# Altium footprint library HW_HOLLAND_NCDM_MONITOR_R1.PcbLib: 472 footprints (part 16 of 30)
Each footprint in its own frame and in the unit in brackets; x right, y up, seen from the top. Pads: shape width x height; smd on the part's side, far side on the other; paste and mask are expansions set on the pad; w line width, h text height; cw(c..) or ccw(c..) is an arc to the next point about the centre after c.
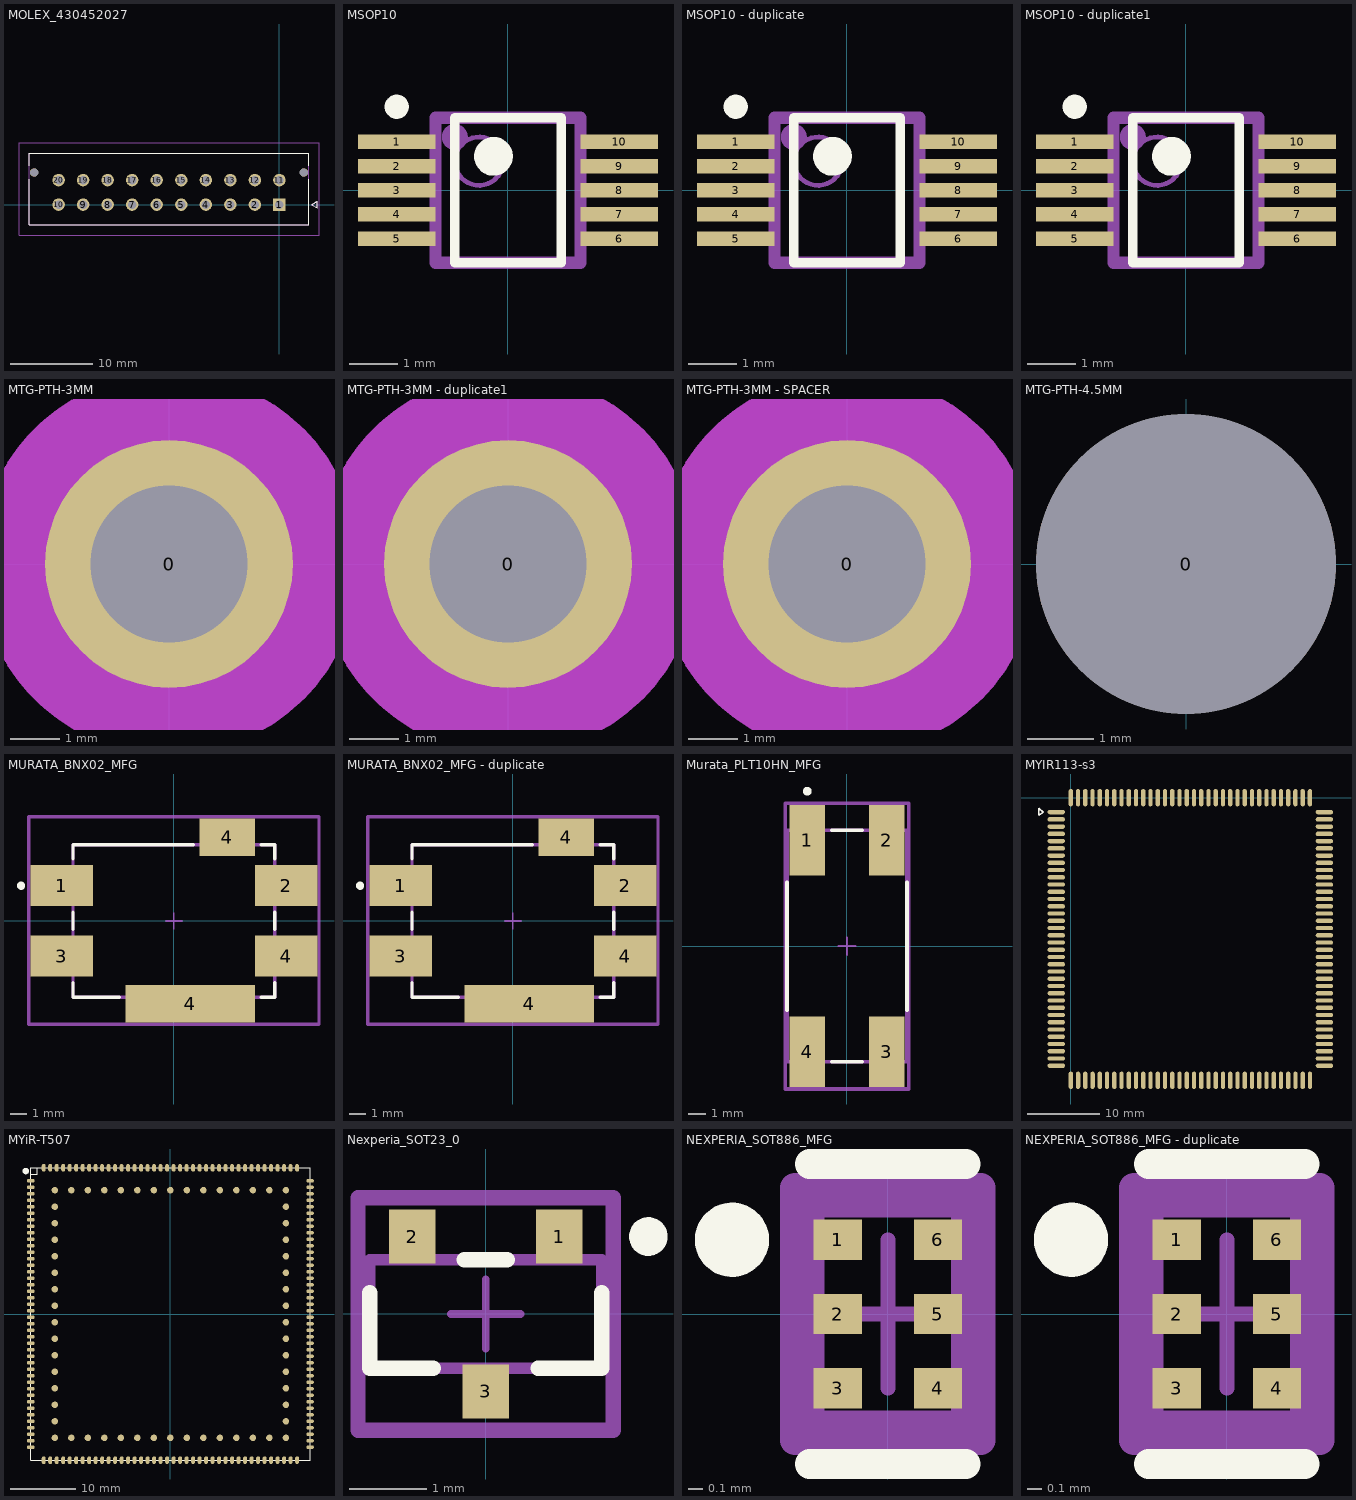
[diagram p15: the footprints below, top view; thin cyan lines are the x and y axes]

## MOLEX_430452027 [mm]
height 9.91
pads (22):
  rect 1.52x1.52 / inner round 1.52 / far side rect 1.52x1.52 hole 1.02 mask+0.076: 1(0,0)
  round 1.52 hole 1.02 mask+0.076: 2(-3,0) 3(-6,0) 4(-9,0) 5(-12,0) 6(-15,0) 7(-18,0) 8(-21,0) 9(-24,0) 10(-27,0) 11(0,3) 12(-3,3) 13(-6,3) 14(-9,3) 15(-12,3) 16(-15,3) 17(-18,3) 18(-21,3) 19(-24,3) 20(-27,3)
  round 1.02 hole 1.02 unplated mask+0.076: ""(-30,3.94) ""(3,3.94)
Top Overlay:
  lines w0.127: -30.575,3.11 -30.575,-2.47 3.575,-2.47 3.575,3.11 ; -30.575,4.77 -30.575,6.3 3.575,6.3 3.575,4.77 ; 3.93,0 4.63,-0.4 4.63,0.4 3.93,0
Mechanical 13:
  lines w0.127: -30.575,-2.47 -30.575,6.3 3.575,6.3 3.575,-2.47 -30.575,-2.47 ; 3.93,0 4.63,-0.4 4.63,0.4 3.93,0
  text "NPTH D1.02 +/- 0.05" at -30.5,-6.24 h0.5
  text "PTH D1.02 +/- 0.05" at -30.5,-5.47 h0.5
Mechanical 15:
  lines w0.05: -31.845,-3.74 -31.845,7.57 4.845,7.57 4.845,-3.74 -31.845,-3.74
3D body "43045-2027.stp": height 9.92, standoff -3.17, extent -30.575,-2.5 3.575,6.27

## MSOP10 [mm]
pads (10):
  rect 1.6x0.3 smd mask+0.05: 1(-2.3,1) 2(-2.3,0.5) 3(-2.3,0) 4(-2.3,-0.5) 5(-2.3,-1) 6(2.3,-1) 7(2.3,-0.5) 8(2.3,0) 9(2.3,0.5) 10(2.3,1)
Top Overlay:
  circle w0.4: c-0.3,0.7 r0.2
  circle w0.25: c-2.3,1.725 r0.125
  lines w0.2: -1.1,-1.5 1.1,-1.5 1.1,1.5 -1.1,1.5 -1.1,-1.5
Top 3D Body:
  circle w0.1: c-0.6,0.6 r0.5
  lines w0.1: -1.5,-1.5 1.5,-1.5 1.5,1.5 -1.5,1.5 -1.5,-1.5
Top Designator:
  circle w0.254: c-1.1,1.1 r0.141
  lines w0.254: -2.3,-1 -1.5,-1 ; -2.3,-0.5 -1.5,-0.5 ; -2.3,0 -1.5,0 ; -2.3,0.5 -1.5,0.5 ; -2.3,1 -1.5,1 ; 1.5,-1 2.3,-1 ; 1.5,-0.5 2.3,-0.5 ; 1.5,0 2.3,0 ; 1.5,0.5 2.3,0.5 ; 1.5,1 2.3,1 ; -1.5,-1.5 -1.5,1.5 1.5,1.5 1.5,-1.5 -1.5,-1.5
  text ".Designator" at -0.339,5.078 h1.02
3D body "MSOP10.step": height 1.1, standoff 0, extent -2.45,-1.5 2.45,1.5

## MSOP10 - duplicate [mm]
pads (10):
  rect 1.6x0.3 smd mask+0.05: 1(-2.3,1) 2(-2.3,0.5) 3(-2.3,0) 4(-2.3,-0.5) 5(-2.3,-1) 6(2.3,-1) 7(2.3,-0.5) 8(2.3,0) 9(2.3,0.5) 10(2.3,1)
Top Overlay:
  circle w0.25: c-2.3,1.725 r0.125
  circle w0.4: c-0.3,0.7 r0.2
  lines w0.2: -1.1,-1.5 -1.1,1.5 1.1,1.5 1.1,-1.5 -1.1,-1.5
Top 3D Body:
  circle w0.1: c-0.6,0.6 r0.5
  lines w0.1: -1.5,-1.5 -1.5,1.5 1.5,1.5 1.5,-1.5 -1.5,-1.5
Top Designator:
  circle w0.254: c-1.1,1.1 r0.141
  lines w0.254: -2.3,-1 -1.5,-1 ; -2.3,-0.5 -1.5,-0.5 ; -2.3,0 -1.5,0 ; -2.3,0.5 -1.5,0.5 ; -2.3,1 -1.5,1 ; 1.5,-1 2.3,-1 ; 1.5,-0.5 2.3,-0.5 ; 1.5,0 2.3,0 ; 1.5,0.5 2.3,0.5 ; 1.5,1 2.3,1 ; -1.5,-1.5 1.5,-1.5 1.5,1.5 -1.5,1.5 -1.5,-1.5
  text ".Designator" at -0.339,5.078 h1.02
3D body "MSOP10.step": height 1.1, standoff 0, extent -2.45,-1.5 2.45,1.5

## MSOP10 - duplicate1 [mm]
pads (10):
  rect 1.6x0.3 smd mask+0.05: 1(-2.3,1) 2(-2.3,0.5) 3(-2.3,0) 4(-2.3,-0.5) 5(-2.3,-1) 6(2.3,-1) 7(2.3,-0.5) 8(2.3,0) 9(2.3,0.5) 10(2.3,1)
Top Overlay:
  circle w0.4: c-0.3,0.7 r0.2
  circle w0.25: c-2.3,1.725 r0.125
  lines w0.2: -1.1,-1.5 1.1,-1.5 1.1,1.5 -1.1,1.5 -1.1,-1.5
Top 3D Body:
  circle w0.1: c-0.6,0.6 r0.5
  lines w0.1: -1.5,-1.5 1.5,-1.5 1.5,1.5 -1.5,1.5 -1.5,-1.5
Top Designator:
  circle w0.254: c-1.1,1.1 r0.141
  lines w0.254: -2.3,-1 -1.5,-1 ; -2.3,-0.5 -1.5,-0.5 ; -2.3,0 -1.5,0 ; -2.3,0.5 -1.5,0.5 ; -2.3,1 -1.5,1 ; 1.5,-1 2.3,-1 ; 1.5,-0.5 2.3,-0.5 ; 1.5,0 2.3,0 ; 1.5,0.5 2.3,0.5 ; 1.5,1 2.3,1 ; -1.5,-1.5 -1.5,1.5 1.5,1.5 1.5,-1.5 -1.5,-1.5
  text ".Designator" at -0.282,2.812 h1.25
3D body "MSOP10.step": height 1.1, standoff 0, extent -2.45,-1.5 2.45,1.5

## MTG-PTH-3MM [mm]
pads (1):
  round 5 hole 3.175: 0(0,0)
Mechanical 1 keep-out:
  circle w1.651: c0,0 r3.028
Top Courtyard keep-out:
  circle w1.651: c0,0 r3.028
Mechanical 12:
  text "NO ROUTE" at -2.005,2.44 h0.5
  text "NO ROUTE" at -1.751,-2.894 h0.5
3D body: height 0.03, standoff 0, extent -3.81,-3.81 0,3.81
3D body: height 0.03, standoff 0, extent 0,-3.81 3.81,3.81

## MTG-PTH-3MM - duplicate1 [mm]
pads (1):
  round 5 hole 3.175: 0(0,0)
Mechanical 1 keep-out:
  circle w1.651: c0,0 r3.028
Top Courtyard keep-out:
  circle w1.651: c0,0 r3.028
Mechanical 12:
  text "NO ROUTE" at -2.159,2.299 h1.25
  text "NO ROUTE" at -1.905,-3.035 h1.25
3D body: height 0.03, standoff 0, extent -3.81,-3.81 0,3.81
3D body: height 0.03, standoff 0, extent 0,-3.81 3.81,3.81

## MTG-PTH-3MM - SPACER [mm]
pads (1):
  round 5 hole 3.175: 0(0,0)
Mechanical 1 keep-out:
  circle w1.651: c0,0 r3.028
Top Courtyard keep-out:
  circle w1.651: c0,0 r3.028
Mechanical 12:
  text "NO ROUTE" at -1.751,-2.894 h0.5
  text "NO ROUTE" at -2.005,2.44 h0.5
3D body: height 0.03, standoff 0, extent 0,-3.81 3.81,3.81
3D body: height 0.03, standoff 0, extent -3.81,-3.81 0,3.81
3D body "9775036360 (rev1).stp": height 1.01, standoff -3.59, extent -3,-3 3,3

## MTG-PTH-4.5MM [mm]
pads (1):
  round 4.5 hole 4.5 unplated: 0(0,0)

## MURATA_BNX02_MFG [mm]
pads (6):
  rect 3.8x2.5 smd paste+0 mask+0: 1(-6.85,2.15) 2(6.85,2.15) 3(-6.85,-2.15) 4(6.85,-2.15)
  rect 7.9x2.3 smd paste+0 mask+0: 4(1,-5.05)
  rect 3.4x2.3 smd paste+0 mask+0: 4(3.25,5.1)
Top Overlay:
  circle w0.25: c-9.325,2.15 r0.125
  lines w0.2: -6.15,-3.775 -6.15,-4.65 -3.325,-4.65 ; -6.15,-0.525 -6.15,0.525 ; -6.15,3.775 -6.15,4.65 1.175,4.65 ; 5.325,-4.65 6.15,-4.65 6.15,-3.775 ; 5.325,4.65 6.15,4.65 6.15,3.775 ; 6.15,-0.525 6.15,0.525
Top Courtyard:
  lines w0.2: -8.85,-6.3 -8.85,6.35 8.85,6.35 8.85,-6.3 -8.85,-6.3
  text ".Designator" at 0,0.213 h1
Mechanical 12:
  lines w0.2: -6.15,-4.65 -6.15,4.65 6.15,4.65 6.15,-4.65 -6.15,-4.65
Mechanical 15:
  lines w0.1: -0.5,0 0.5,0 ; 0,-0.5 0,0.5
  lines w0.2: -8.85,-6.3 -8.85,6.35 8.85,6.35 8.85,-6.3 -8.85,-6.3
3D body "Filter_Murata_BNX024H01L_eec.STEP": height 3.35, standoff 0, extent -6.05,-4.55 6.05,4.55

## MURATA_BNX02_MFG - duplicate [mm]
pads (6):
  rect 3.8x2.5 smd paste+0 mask+0: 1(-6.85,2.15) 2(6.85,2.15) 3(-6.85,-2.15) 4(6.85,-2.15)
  rect 7.9x2.3 smd paste+0 mask+0: 4(1,-5.05)
  rect 3.4x2.3 smd paste+0 mask+0: 4(3.25,5.1)
Top Overlay:
  circle w0.25: c-9.325,2.15 r0.125
  lines w0.2: -6.15,-3.775 -6.15,-4.65 -3.325,-4.65 ; -6.15,-0.525 -6.15,0.525 ; -6.15,3.775 -6.15,4.65 1.175,4.65 ; 5.325,-4.65 6.15,-4.65 6.15,-3.775 ; 5.325,4.65 6.15,4.65 6.15,3.775 ; 6.15,-0.525 6.15,0.525
Top Courtyard:
  lines w0.2: -8.85,-6.3 -8.85,6.35 8.85,6.35 8.85,-6.3 -8.85,-6.3
  text ".Designator" at 0,0.213 h1
Mechanical 12:
  lines w0.2: -6.15,-4.65 -6.15,4.65 6.15,4.65 6.15,-4.65 -6.15,-4.65
Mechanical 15:
  lines w0.1: -0.5,0 0.5,0 ; 0,-0.5 0,0.5
  lines w0.2: -8.85,-6.3 -8.85,6.35 8.85,6.35 8.85,-6.3 -8.85,-6.3
3D body "Filter_Murata_BNX024H01L_eec.STEP": height 3.35, standoff 0, extent -6.05,-4.55 6.05,4.55

## Murata_PLT10HN_MFG [mm]
pads (4):
  rect 2x4 smd paste+0 mask+0: 1(-2.25,6) 2(2.25,6) 3(2.25,-6) 4(-2.25,-6)
Top Overlay:
  circle w0.25: c-2.25,8.775 r0.125
  lines w0.2: -3.4,-3.625 -3.4,3.625 ; -0.875,-6.55 0.875,-6.55 ; -0.875,6.55 0.875,6.55 ; 3.4,-3.625 3.4,3.625
Top Courtyard:
  lines w0.2: -3.5,-8.1 3.5,-8.1 3.5,8.1 -3.5,8.1 -3.5,-8.1
  text ".Designator" at 0,0.235 h1.25
Mechanical 12:
  lines w0.2: -3.4,-6.55 3.4,-6.55 3.4,6.55 -3.4,6.55 -3.4,-6.55
Mechanical 15:
  lines w0.1: -0.5,0 0.5,0 ; 0,-0.5 0,0.5
  lines w0.2: -3.5,-8.1 3.5,-8.1 3.5,8.1 -3.5,8.1 -3.5,-8.1
3D body "Ind_Murata_PLT10HH501100PNL_eec.STEP": height 9.4, standoff 0, extent -3.302,-6.706 3.298,6.694

## MYIR113-s3 [mm]
pads (140):
  oval 2.4x0.6 / inner oval 2.4x0.6 / far side round 0 all layers, no hole mask+0: 1(-2,-1.988) 2(-2,-2.988) 3(-2,-3.988) 4(-2,-4.988) 5(-2,-5.988) 6(-2,-6.988) 7(-2,-7.988) 8(-2,-8.988) 9(-2,-9.988) 10(-2,-10.988) 11(-2,-11.988) 12(-2,-12.988) 13(-2,-13.988) 14(-2,-14.988) 15(-2,-15.988) 16(-2,-16.988) 17(-2,-17.988) 18(-2,-18.988) 19(-2,-19.988) 20(-2,-20.988) 21(-2,-21.988) 22(-2,-22.988) 23(-2,-23.988) 24(-2,-24.988) 25(-2,-25.988) 26(-2,-26.988) 27(-2,-27.988) 28(-2,-28.988) 29(-2,-29.988) 30(-2,-30.988) 31(-2,-31.988) 32(-2,-32.988) 33(-2,-33.988) 34(-2,-34.988) 35(-2,-35.988) 36(-2,-36.988) 71(35,-36.988) 72(35,-35.988) 73(35,-34.988) 74(35,-33.988) 75(35,-32.988) 76(35,-31.988) 77(35,-30.988) 78(35,-29.988) 79(35,-28.988) 80(35,-27.988) 81(35,-26.988) 82(35,-25.988) 83(35,-24.988) 84(35,-23.988) 85(35,-22.988) 86(35,-21.988) 87(35,-20.988) 88(35,-19.988) 89(35,-18.988) 90(35,-17.988) 91(35,-16.988) 92(35,-15.988) 93(35,-14.988) 94(35,-13.988) 95(35,-12.988) 96(35,-11.988) 97(35,-10.988) 98(35,-9.988) 99(35,-8.988) 100(35,-7.988) 101(35,-6.988) 102(35,-5.988) 103(35,-4.988) 104(35,-3.988) 105(35,-2.988) 106(35,-1.988)
  oval 0.6x2.4 / inner oval 0.6x2.4 / far side round 0 all layers, no hole mask+0: 37(0.008,-39) 38(1.008,-39) 39(2.008,-39) 40(3.008,-39) 41(4.008,-39) 42(5.008,-39) 43(6.008,-39) 44(7.008,-39) 45(8.008,-39) 46(9.008,-39) 47(10.008,-39) 48(11.008,-39) 49(12.008,-39) 50(13.008,-39) 51(14.008,-39) 52(15.008,-39) 53(16.008,-39) 54(17.008,-39) 55(18.008,-39) 56(19.008,-39) 57(20.008,-39) 58(21.008,-39) 59(22.008,-39) 60(23.008,-39) 61(24.008,-39) 62(25.008,-39) 63(26.008,-39) 64(27.008,-39) 65(28.008,-39) 66(29.008,-39) 67(30.008,-39) 68(31.008,-39) 69(32.008,-39) 70(33.008,-39) 107(33,0) 108(32,0) 109(31,0) 110(30,0) 111(29,0) 112(28,0) 113(27,0) 114(26,0) 115(25,0) 116(24,0) 117(23,0) 118(22,0) 119(21,0) 120(20,0) 121(19,0) 122(18,0) 123(17,0) 124(16,0) 125(15,0) 126(14,0) 127(13,0) 128(12,0) 129(11,0) 130(10,0) 131(9,0) 132(8,0) 133(7,0) 134(6,0) 135(5,0) 136(4,0) 137(3,0) 138(2,0) 139(1,0) 140(0,0)
Top Overlay:
  lines w0.2: -4.4,-2.438 -3.8,-1.988 -4.4,-1.488 -4.4,-2.438
3D body "T113-S3-ETH.step": height 4.6, standoff 0.04, extent -2,-39 35,0

## MYiR-T507 [mm]
pads (222):
  oval 1.171x0.6 smd: 1(-21.5,20.5) 2(-21.5,19.5) 3(-21.5,18.5) 4(-21.5,17.5) 5(-21.5,16.5) 6(-21.5,15.5) 7(-21.5,14.5) 8(-21.5,13.5) 9(-21.5,12.5) 10(-21.5,11.5) 11(-21.5,10.5) 12(-21.5,9.5) 13(-21.5,8.5) 14(-21.5,7.5) 15(-21.5,6.5) 16(-21.5,5.5) 17(-21.5,4.5) 18(-21.5,3.5) 19(-21.5,2.5) 20(-21.5,1.5) 21(-21.5,0.5) 22(-21.5,-0.5) 23(-21.5,-1.5) 24(-21.5,-2.5) 25(-21.5,-3.5) 26(-21.5,-4.5) 27(-21.5,-5.5) 28(-21.5,-6.5) 29(-21.5,-7.5) 30(-21.5,-8.5) 31(-21.5,-9.5) 32(-21.5,-10.5) 33(-21.5,-11.5) 34(-21.5,-12.5) 35(-21.5,-13.5) 36(-21.5,-14.5) 37(-21.5,-15.5) 38(-21.5,-16.5) 39(-21.5,-17.5) 40(-21.5,-18.5) 41(-21.5,-19.5) 42(-21.5,-20.5) 83(21.5,-20.5) 84(21.5,-19.5) 85(21.5,-18.5) 86(21.5,-17.5) 87(21.5,-16.5) 88(21.5,-15.5) 89(21.5,-14.5) 90(21.5,-13.5) 91(21.5,-12.5) 92(21.5,-11.5) 93(21.5,-10.5) 94(21.5,-9.5) 95(21.5,-8.5) 96(21.5,-7.5) 97(21.5,-6.5) 98(21.5,-5.5) 99(21.5,-4.5) 100(21.5,-3.5) 101(21.5,-2.5) 102(21.5,-1.5) 103(21.5,-0.5) 104(21.5,0.5) 105(21.5,1.5) 106(21.5,2.5) 107(21.5,3.5) 108(21.5,4.5) 109(21.5,5.5) 110(21.5,6.5) 111(21.5,7.5) 112(21.5,8.5) 113(21.5,9.5) 114(21.5,10.5) 115(21.5,11.5) 116(21.5,12.5) 117(21.5,13.5) 118(21.5,14.5) 119(21.5,15.5) 120(21.5,16.5) 121(21.5,17.5) 122(21.5,18.5) 123(21.5,19.5) 124(21.5,20.5)
  oval 0.6x1.171 smd: 43(-19.5,-22.5) 44(-18.5,-22.5) 45(-17.5,-22.5) 46(-16.5,-22.5) 47(-15.5,-22.5) 48(-14.5,-22.5) 49(-13.5,-22.5) 50(-12.5,-22.5) 51(-11.5,-22.5) 52(-10.5,-22.5) 53(-9.5,-22.5) 54(-8.5,-22.5) 55(-7.5,-22.5) 56(-6.5,-22.5) 57(-5.5,-22.5) 58(-4.5,-22.5) 59(-3.5,-22.5) 60(-2.5,-22.5) 61(-1.5,-22.5) 62(-0.5,-22.5) 63(0.5,-22.5) 64(1.5,-22.5) 65(2.5,-22.5) 66(3.5,-22.5) 67(4.5,-22.5) 68(5.5,-22.5) 69(6.5,-22.5) 70(7.5,-22.5) 71(8.5,-22.5) 72(9.5,-22.5) 73(10.5,-22.5) 74(11.5,-22.5) 75(12.5,-22.5) 76(13.5,-22.5) 77(14.5,-22.5) 78(15.5,-22.5) 79(16.5,-22.5) 80(17.5,-22.5) 81(18.5,-22.5) 82(19.5,-22.5) 125(19.5,22.5) 126(18.5,22.5) 127(17.5,22.5) 128(16.5,22.5) 129(15.5,22.5) 130(14.5,22.5) 131(13.5,22.5) 132(12.5,22.5) 133(11.5,22.5) 134(10.5,22.5) 135(9.5,22.5) 136(8.5,22.5) 137(7.5,22.5) 138(6.5,22.5) 139(5.5,22.5) 140(4.5,22.5) 141(3.5,22.5) 142(2.5,22.5) 143(1.5,22.5) 144(0.5,22.5) 145(-0.5,22.5) 146(-1.5,22.5) 147(-2.5,22.5) 148(-3.5,22.5) 149(-4.5,22.5) 150(-5.5,22.5) 151(-6.5,22.5) 152(-7.5,22.5) 153(-8.5,22.5) 154(-9.5,22.5) 155(-10.5,22.5) 156(-11.5,22.5) 157(-12.5,22.5) 158(-13.5,22.5) 159(-14.5,22.5) 160(-15.5,22.5) 161(-16.5,22.5) 162(-17.5,22.5) 163(-18.5,22.5) 164(-19.5,22.5)
  round 1 smd: L1(-17.78,19.05) L2(-17.78,16.51) L3(-17.78,13.97) L4(-17.78,11.43) L5(-17.78,8.89) L6(-17.78,6.35) L7(-17.78,3.81) L8(-17.78,1.27) L9(-17.78,-1.27) L10(-17.78,-3.81) L11(-17.78,-6.35) L12(-17.78,-8.89) L13(-17.78,-11.43) L14(-17.78,-13.97) L15(-17.78,-16.51) L16(-17.78,-19.05) L17(-15.24,-19.05) L18(-12.7,-19.05) L19(-10.16,-19.05) L20(-7.62,-19.05) L21(-5.08,-19.05) L22(-2.54,-19.05) L23(0,-19.05) L24(2.54,-19.05) L25(5.08,-19.05) L26(7.62,-19.05) L27(10.16,-19.05) L28(12.7,-19.05) L29(15.24,-19.05) L30(17.78,-19.05) L31(17.78,-16.51) L32(17.78,-13.97) L33(17.78,-11.43) L34(17.78,-8.89) L35(17.78,-6.35) L36(17.78,-3.81) L37(17.78,-1.27) L38(17.78,1.27) L39(17.78,3.81) L40(17.78,6.35) L41(17.78,8.89) L42(17.78,11.43) L43(17.78,13.97) L44(17.78,16.51) L45(17.78,19.05) L46(15.24,19.05) L47(12.7,19.05) L48(10.16,19.05) L49(7.62,19.05) L50(5.08,19.05) L51(2.54,19.05) L52(0,19.05) L53(-2.54,19.05) L54(-5.08,19.05) L55(-7.62,19.05) L56(-10.16,19.05) L57(-12.7,19.05) L58(-15.24,19.05)
Top Overlay:
  circle w0.5: c-22.258,22.002 r0.25
  lines w0.15: -21.5,21.5 -20.5,21.5 -20.5,22.5 ; -21.5,-22.5 21.5,-22.5 21.5,22.5 -21.5,22.5 -21.5,-22.5
  text ".Designator" at -22.153,-22.765 h0.76
3D body: height 0.8, standoff 0, extent -21.5,-22.5 21.5,22.5

## Nexperia_SOT23_0 [mm]
pads (3):
  rect 0.6x0.7 smd paste-1000 mask+0: 1(0.95,1) 2(-0.95,1) 3(0,-1)
Top Overlay:
  circle w0.25: c2.1,1 r0.125
  lines w0.2: -1.5,0.275 -1.5,-0.7 -0.675,-0.7 ; -0.275,0.7 0.275,0.7 ; 0.675,-0.7 1.5,-0.7 1.5,0.275
Top Paste:
  rectangle: -0.249,-1.3 0.251,-0.7
  rectangle: -1.2,0.7 -0.7,1.3
  rectangle: 0.7,0.7 1.2,1.3
Top Courtyard:
  lines w0.2: -1.65,-1.5 1.65,-1.5 1.65,1.5 -1.65,1.5 -1.65,-1.5
  text ".Designator" at 0,0 h1
Mechanical 12:
  lines w0.15: -1.5,-0.7 1.5,-0.7 1.5,0.7 -1.5,0.7 -1.5,-0.7
Mechanical 15:
  lines w0.1: -0.45,0 0.45,0 ; 0,-0.45 0,0.45
  lines w0.2: -1.65,-1.5 1.65,-1.5 1.65,1.5 -1.65,1.5 -1.65,-1.5
3D body "Diode_Nexperia_PESD12VL2BT,215_eec.STEP": height 0.25, standoff 0, extent -1.65,-1.5 1.65,1.5

## NEXPERIA_SOT886_MFG [mm]
pads (6):
  rect 0.325x0.27 smd paste+0 mask+0: 1(-0.337,0.5) 2(-0.337,0) 3(-0.337,-0.5) 4(0.337,-0.5) 5(0.337,0) 6(0.337,0.5)
Top Overlay:
  circle w0.25: c-1.05,0.5 r0.125
  lines w0.2: -0.525,-1.01 0.525,-1.01 ; -0.525,1.01 0.525,1.01
Top Courtyard:
  lines w0.2: -0.625,-0.85 -0.625,0.85 0.625,0.85 0.625,-0.85 -0.625,-0.85
  text ".Designator" at 0,0 h1
Mechanical 12:
  lines w0.2: -0.525,-0.75 -0.525,0.75 0.525,0.75 0.525,-0.75 -0.525,-0.75
Mechanical 15:
  lines w0.1: -0.5,0 0.5,0 ; 0,-0.5 0,0.5
  lines w0.2: -0.625,-0.85 -0.625,0.85 0.625,0.85 0.625,-0.85 -0.625,-0.85
3D body "Diode_Nexperia_PRTR5V0U2F,115_eec.STEP": height 0.5, standoff 0, extent -0.5,-0.725 0.5,0.725

## NEXPERIA_SOT886_MFG - duplicate [mm]
pads (6):
  rect 0.325x0.27 smd paste+0 mask+0: 1(-0.337,0.5) 2(-0.337,0) 3(-0.337,-0.5) 4(0.337,-0.5) 5(0.337,0) 6(0.337,0.5)
Top Overlay:
  circle w0.25: c-1.05,0.5 r0.125
  lines w0.2: -0.525,-1.01 0.525,-1.01 ; -0.525,1.01 0.525,1.01
Top Courtyard:
  lines w0.2: -0.625,-0.85 -0.625,0.85 0.625,0.85 0.625,-0.85 -0.625,-0.85
  text ".Designator" at 0,0 h1
Mechanical 12:
  lines w0.2: -0.525,-0.75 -0.525,0.75 0.525,0.75 0.525,-0.75 -0.525,-0.75
Mechanical 15:
  lines w0.1: -0.5,0 0.5,0 ; 0,-0.5 0,0.5
  lines w0.2: -0.625,-0.85 -0.625,0.85 0.625,0.85 0.625,-0.85 -0.625,-0.85
3D body "Diode_Nexperia_PRTR5V0U2F,115_eec.STEP": height 0.5, standoff 0, extent -0.5,-0.725 0.5,0.725